# Altium integrated library myIOT_lib.IntLib: 300 symbols (part 1 of 3) (continued)
## LPC11U68JBD100 (continued)

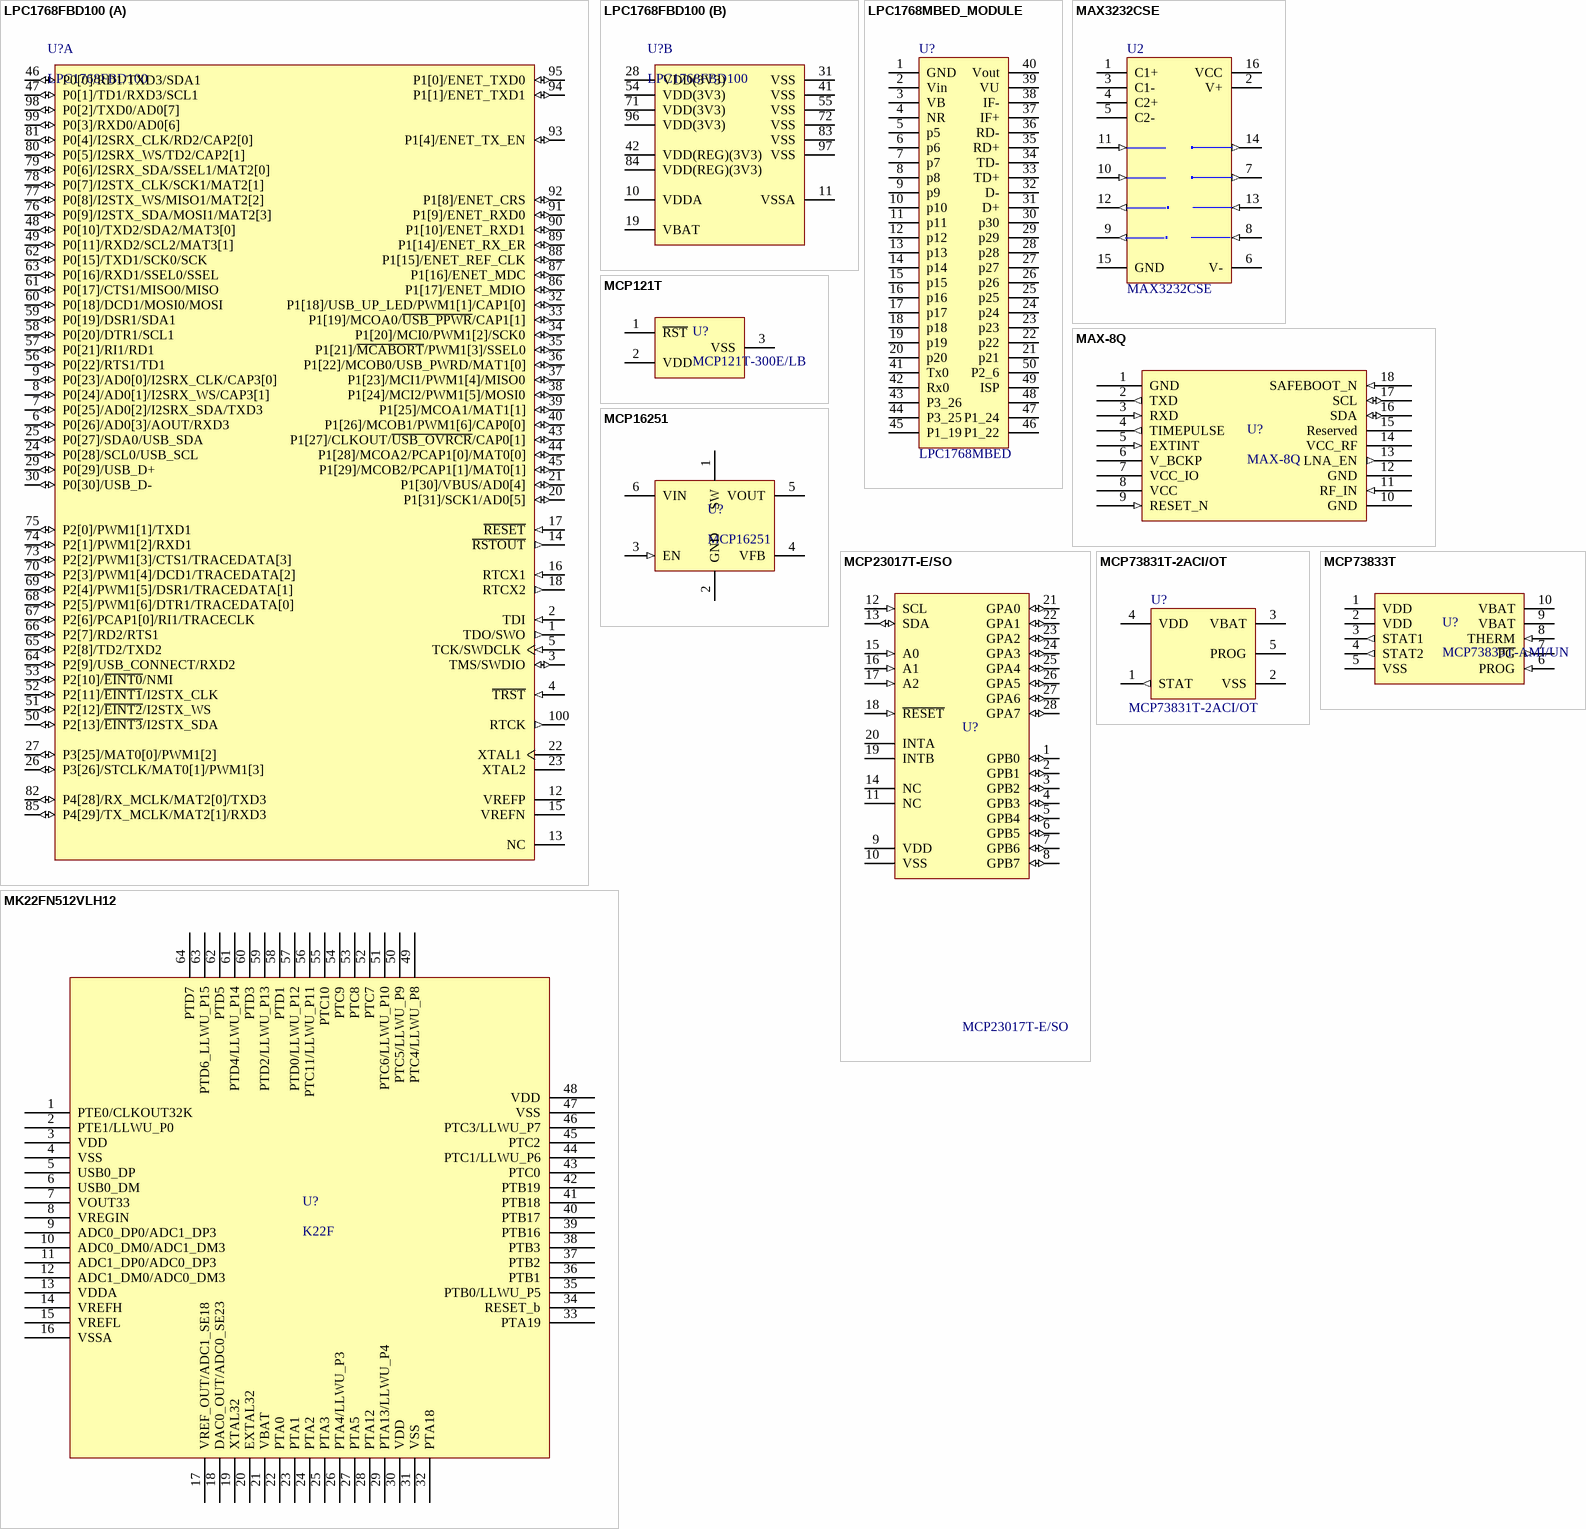
[diagram p7: symbols LPC1768FBD100 to MK22FN512VLH12]

## LPC1768FBD100
designator U?
32-Bit ARM Cortex-M3 Microcontroller, Ethernet, USB 2.0 Host / Device / OTG, CAN, 512 KB Flash, 64 KB SRAM, -40 to 85 degC, 100-Pin LQFP (SOT407-1), RoHS, Tray; MFG P/N: LPC1768FBD100K; Anunda_Code: M1200; MFG: NXP USA Inc.; RoHSCompliant: true; Width: 18.8 mm; DatasheetVersion: Rev. 9.6 , 08/2015; PackageReference: SOT407-1; Pins: 4; REACH SVHC: Unknown; Radiation Hardening: No; Packaging: Tray; PackageDescription: 100-Pin Plastic Low Profile Quad Flat Package, Body 14 x 14 mm; Value: LPC1768FBD100
footprint NXP-SOT407-1_V
part A pins: 1 TDO/SWO (out), 2 TDI (in), 3 TMS/SWDIO (io), 4 ~{TRST} (in), 5 TCK/SWDCLK (in), 6 P0[26]/AD0[3]/AOUT/RXD3 (io), 7 P0[25]/AD0[2]/I2SRX_SDA/TXD3 (io), 8 P0[24]/AD0[1]/I2SRX_WS/CAP3[1] (io), 9 P0[23]/AD0[0]/I2SRX_CLK/CAP3[0] (io), 12 VREFP, 13 NC, 14 ~{RSTOUT} (out), 15 VREFN, 16 RTCX1 (in), 17 ~{RESET} (in), 18 RTCX2 (out), 20 P1[31]/SCK1/AD0[5] (io), 21 P1[30]/VBUS/AD0[4] (io), 22 XTAL1, 23 XTAL2, 24 P0[28]/SCL0/USB_SCL (io), 25 P0[27]/SDA0/USB_SDA (io), 26 P3[26]/STCLK/MAT0[1]/PWM1[3] (io), 27 P3[25]/MAT0[0]/PWM1[2] (io), 29 P0[29]/USB_D+ (io), 30 P0[30]/USB_D- (io), 32 P1[18]/USB_UP_LED/PWM1[1]/CAP1[0] (io), 33 P1[19]/MCOA0/~{USB_PPWR}/CAP1[1] (io), 34 P1[20]/MCI0/PWM1[2]/SCK0 (io), 35 P1[21]/~{MCABORT}/PWM1[3]/SSEL0 (io), 36 P1[22]/MCOB0/USB_PWRD/MAT1[0] (io), 37 P1[23]/MCI1/PWM1[4]/MISO0 (io), 38 P1[24]/MCI2/PWM1[5]/MOSI0 (io), 39 P1[25]/MCOA1/MAT1[1] (io), 40 P1[26]/MCOB1/PWM1[6]/CAP0[0] (io), 43 P1[27]/CLKOUT/~{USB_OVRCR}/CAP0[1] (io), 44 P1[28]/MCOA2/PCAP1[0]/MAT0[0] (io), 45 P1[29]/MCOB2/PCAP1[1]/MAT0[1] (io), 46 P0[0]/RD1/TXD3/SDA1 (io), 47 P0[1]/TD1/RXD3/SCL1 (io), 48 P0[10]/TXD2/SDA2/MAT3[0] (io), 49 P0[11]/RXD2/SCL2/MAT3[1] (io), 50 P2[13]/~{EINT3}/I2STX_SDA (io), 51 P2[12]/~{EINT2}/I2STX_WS (io), 52 P2[11]/~{EINT1}/I2STX_CLK (io), 53 P2[10]/~{EINT0}/NMI (io), 56 P0[22]/RTS1/TD1 (io), 57 P0[21]/RI1/RD1 (io), 58 P0[20]/DTR1/SCL1 (io), 59 P0[19]/DSR1/SDA1 (io), 60 P0[18]/DCD1/MOSI0/MOSI (io), 61 P0[17]/CTS1/MISO0/MISO (io), 62 P0[15]/TXD1/SCK0/SCK (io), 63 P0[16]/RXD1/SSEL0/SSEL (io), 64 P2[9]/USB_CONNECT/RXD2 (io), 65 P2[8]/TD2/TXD2 (io), 66 P2[7]/RD2/RTS1 (io), 67 P2[6]/PCAP1[0]/RI1/TRACECLK (io), 68 P2[5]/PWM1[6]/DTR1/TRACEDATA[0] (io), 69 P2[4]/PWM1[5]/DSR1/TRACEDATA[1] (io), 70 P2[3]/PWM1[4]/DCD1/TRACEDATA[2] (io), 73 P2[2]/PWM1[3]/CTS1/TRACEDATA[3] (io), 74 P2[1]/PWM1[2]/RXD1 (io), 75 P2[0]/PWM1[1]/TXD1 (io), 76 P0[9]/I2STX_SDA/MOSI1/MAT2[3] (io), 77 P0[8]/I2STX_WS/MISO1/MAT2[2] (io), 78 P0[7]/I2STX_CLK/SCK1/MAT2[1] (io), 79 P0[6]/I2SRX_SDA/SSEL1/MAT2[0] (io), 80 P0[5]/I2SRX_WS/TD2/CAP2[1] (io), 81 P0[4]/I2SRX_CLK/RD2/CAP2[0] (io), 82 P4[28]/RX_MCLK/MAT2[0]/TXD3 (io), 85 P4[29]/TX_MCLK/MAT2[1]/RXD3 (io), 86 P1[17]/ENET_MDIO (io), 87 P1[16]/ENET_MDC (io), 88 P1[15]/ENET_REF_CLK (io), 89 P1[14]/ENET_RX_ER (io), 90 P1[10]/ENET_RXD1 (io), 91 P1[9]/ENET_RXD0 (io), 92 P1[8]/ENET_CRS (io), 93 P1[4]/ENET_TX_EN (io), 94 P1[1]/ENET_TXD1 (io), 95 P1[0]/ENET_TXD0 (io), 98 P0[2]/TXD0/AD0[7] (io), 99 P0[3]/RXD0/AD0[6] (io), 100 RTCK (out)
part B pins: 10 VDDA (power), 11 VSSA (power), 19 VBAT (power), 28 VDD(3V3) (power), 31 VSS (power), 41 VSS (power), 42 VDD(REG)(3V3) (power), 54 VDD(3V3) (power), 55 VSS (power), 71 VDD(3V3) (power), 72 VSS (power), 83 VSS (power), 84 VDD(REG)(3V3) (power), 96 VDD(3V3) (power), 97 VSS (power)

## LPC1768MBED_MODULE
designator U?, comment LPC1768MBED
LPC1768 MBED MODULE
footprint LPC_mini
pins: 1 GND, 2 Vin, 3 VB, 4 NR, 5 p5, 6 p6, 7 p7, 8 p8, 9 p9, 10 p10, 11 p11, 12 p12, 13 p13, 14 p14, 15 p15, 16 p16, 17 p17, 18 p18, 19 p19, 20 p20, 21 p21, 22 p22, 23 p23, 24 p24, 25 p25, 26 p26, 27 p27, 28 p28, 29 p29, 30 p30, 31 D+, 32 D-, 33 TD+, 34 TD-, 35 RD+, 36 RD-, 37 IF+, 38 IF-, 39 VU, 40 Vout, 41 Tx0, 42 Rx0, 43 P3_26, 44 P3_25, 45 P1_19, 46 P1_22, 47 P1_24, 48, 49 ISP, 50 P2_6

## MAX3232CSE
designator U2
3.0V TO 5.5V, Low-Power, up to 1Mbps, True RS-232 Transceiver Using Four 0.1ตF External Capacitor; Anunda_Code: M1363; MFG: Analog Devices Inc; MFG P/N: MAX3232CSE+T; Published: 16-Jan-2001; LatestRevisionDate: 13-Apr-2006; LatestRevisionNote: IPC-7351 Footprint Added.; DatasheetVersion: Mar-1999; PackageReference: NSO16; Publisher: Altium Limited; PackageDescription: 16-Pin Small Outline Integrated Circuit 1.27 mm Pitch; Code_JEDEC: MS-012-AC; Code_IPC: SOIC127P600-16
footprint SOIC16N_N (SOIC, 16-Leads, Body 9.9x3.9mm, Pitch 1.27mm, IPC Medium Density)
3D model NSO16 (16-Pin Small Outline Integrated Circuit 1.27 mm Pitch)
pins: 1 C1+, 2 V+ (power), 3 C1-, 4 C2+, 5 C2-, 6 V- (power), 7 T2OUT (out), 8 R2IN (in), 9 R2OUT (out), 10 T2IN (in), 11 T1IN (in), 12 R1OUT (out), 13 R1IN (in), 14 T1OUT (out), 15 GND (power), 16 VCC (power)

## MAX-8Q
designator U?
GNSS Module, Model : MAX-8Q with GPS, Ublox; Anunda_Code: N2035; Value: MAX-8Q
footprint MAX-8Q (MAX-8Q U-Blox GNSS)
pins: 1 GND, 2 TXD (out), 3 RXD (in), 4 TIMEPULSE (out), 5 EXTINT (in), 6 V_BCKP, 7 VCC_IO, 8 VCC, 9 RESET_N (in), 10 GND, 11 RF_IN (in), 12 GND, 13 LNA_EN (out), 14 VCC_RF, 15 Reserved, 16 SDA (io), 17 SCL (io), 18 SAFEBOOT_N (in)

## MCP121T
designator U?, comment MCP121T-300E/LB
MCP121T-300E/LB Micropower Voltage Supervisor 2.93V,Active LOW; Value: MCP121T-300E/LB
footprint SOT23_N_2
pins: 1 ~{RST}, 2 VDD, 3 VSS

## MCP16251
designator U?
Low Quiescent Current, PFM/PWM Synchronous Boost Regulator sot23-6
footprint SOT23-6
pins: 1 SW, 2 GND, 3 EN (in), 4 VFB, 5 VOUT, 6 VIN

## MCP23017T-E/SO
designator U?
16-Bit I/O Expander with Serial Interface, 28-Pin SOIC, Extended Temperature, Tape and Reel; Anunda_Code: M1934; DatasheetVersion: revB, Feb-2007; PackageVersion: revBB, Aug-2009; PackageReference: SOIC-SO28; Publisher: Altium Limited; PackageDescription: 28-Lead Plastic Small Outline (SO) - Wide 7.50mm Body [SOIC]; Supplier 1: Digi-Key; Supplier Part Number 1: MCP23017T-E/SO-ND; Supplier 2: Newark; Supplier Part Number 2: 31K2962; Code_JEDEC: MS-013
footprint SOIC-SO28_N (SOIC, 28-Leads, Body 17.9x7.5mm, Pitch 1.27mm, IPC Medium Density)
pins: 1 GPB0 (io), 2 GPB1 (io), 3 GPB2 (io), 4 GPB3 (io), 5 GPB4 (io), 6 GPB5 (io), 7 GPB6 (io), 8 GPB7 (io), 9 VDD (power), 10 VSS (power), 11 NC, 12 SCL (in), 13 SDA (io), 14 NC, 15 A0 (in), 16 A1 (in), 17 A2 (in), 18 ~{RESET} (in), 19 INTB (oc), 20 INTA (oc), 21 GPA0 (io), 22 GPA1 (io), 23 GPA2 (io), 24 GPA3 (io), 25 GPA4 (io), 26 GPA5 (io), 27 GPA6 (io), 28 GPA7 (io)

## MCP73831T-2ACI/OT
designator U?
Miniature Single-Cell, Fully Integrated Li-Ion, Li-Polymer Charge Management Controller, 4.2V, 5-Pin SOT-23, Industrial Temperature, Tape and Reel; Published: 29-Jan-2009; LatestRevisionDate: 27-Nov-2009; LatestRevisionNote: Updated to datasheet revision E, Sep-2008; DatasheetVersion: revE, Sep-2008; PackageVersion: revBB, Aug-2009; PackageReference: SOT-23-OT5; Publisher: Altium Limited; PackageDescription: 5-Lead Plastic Small Outline Transistor (OT) [SOT-23]; Supplier 1: Digi-Key; Supplier Part Number 1: MCP73831T-2ACI/OTTR-ND; Supplier 2: Digi-Key; Supplier Part Number 2: MCP73831T-2ACI/OTCT-ND; Supplier 3: Digi-Key; Supplier Part Number 3: MCP73831T-2ACI/OTDKR-ND; Supplier 4: Farnell; Supplier Part Number 4: 1332158; Code_IPC: SOT23-5
footprint SOT235 (SOT23, 5-Leads, Body 2.90x2.80mm, Pitch 0.95mm, IPC Medium Density)
pins: 1 STAT (out), 2 VSS (power), 3 VBAT (power), 4 VDD (power), 5 PROG

## MCP73833T
designator U?, comment MCP73833T-AMI/UN
MCP73833T Stand-Alone Linear Li-Ion / Li-Po Charge / Management Controller; Value: MCP73833T-AMI/UN
footprint MSOP10 (TSSOP, 10-Leads, Body 3.00x3.00mm, Pitch 0.50mm, IPC Medium Density)
pins: 1 VDD, 2 VDD, 3 STAT1 (out), 4 STAT2 (out), 5 VSS, 6 PROG (in), 7 ~{PG} (out), 8 THERM (in), 9 VBAT, 10 VBAT

## MK22FN512VLH12
designator U?, comment K22F
IC MK22FN512VLH12 MCU 32-Bit 512KB Flash 64LQFP ARM Cortec-M4; Anunda_Code: M2051
footprint LQFP64 (TSQFP, 64-Leads, Body 10.00x10.00mm, Pitch 0.50mm, IPC Medium Density)
pins: 1 PTE0/CLKOUT32K, 2 PTE1/LLWU_P0, 3 VDD, 4 VSS, 5 USB0_DP, 6 USB0_DM, 7 VOUT33, 8 VREGIN, 9 ADC0_DP0/ADC1_DP3, 10 ADC0_DM0/ADC1_DM3, 11 ADC1_DP0/ADC0_DP3, 12 ADC1_DM0/ADC0_DM3, 13 VDDA, 14 VREFH, 15 VREFL, 16 VSSA, 17 VREF_OUT/ADC1_SE18, 18 DAC0_OUT/ADC0_SE23, 19 XTAL32, 20 EXTAL32, 21 VBAT, 22 PTA0, 23 PTA1, 24 PTA2, 25 PTA3, 26 PTA4/LLWU_P3, 27 PTA5, 28 PTA12, 29 PTA13/LLWU_P4, 30 VDD, 31 VSS, 32 PTA18, 33 PTA19, 34 RESET_b, 35 PTB0/LLWU_P5, 36 PTB1, 37 PTB2, 38 PTB3, 39 PTB16, 40 PTB17, 41 PTB18, 42 PTB19, 43 PTC0, 44 PTC1/LLWU_P6, 45 PTC2, 46 PTC3/LLWU_P7, 47 VSS, 48 VDD, 49 PTC4/LLWU_P8, 50 PTC5/LLWU_P9, 51 PTC6/LLWU_P10, 52 PTC7, 53 PTC8, 54 PTC9, 55 PTC10, 56 PTC11/LLWU_P11, 57 PTD0/LLWU_P12, 58 PTD1, 59 PTD2/LLWU_P13, 60 PTD3, 61 PTD4/LLWU_P14, 62 PTD5, 63 PTD6_LLWU_P15, 64 PTD7

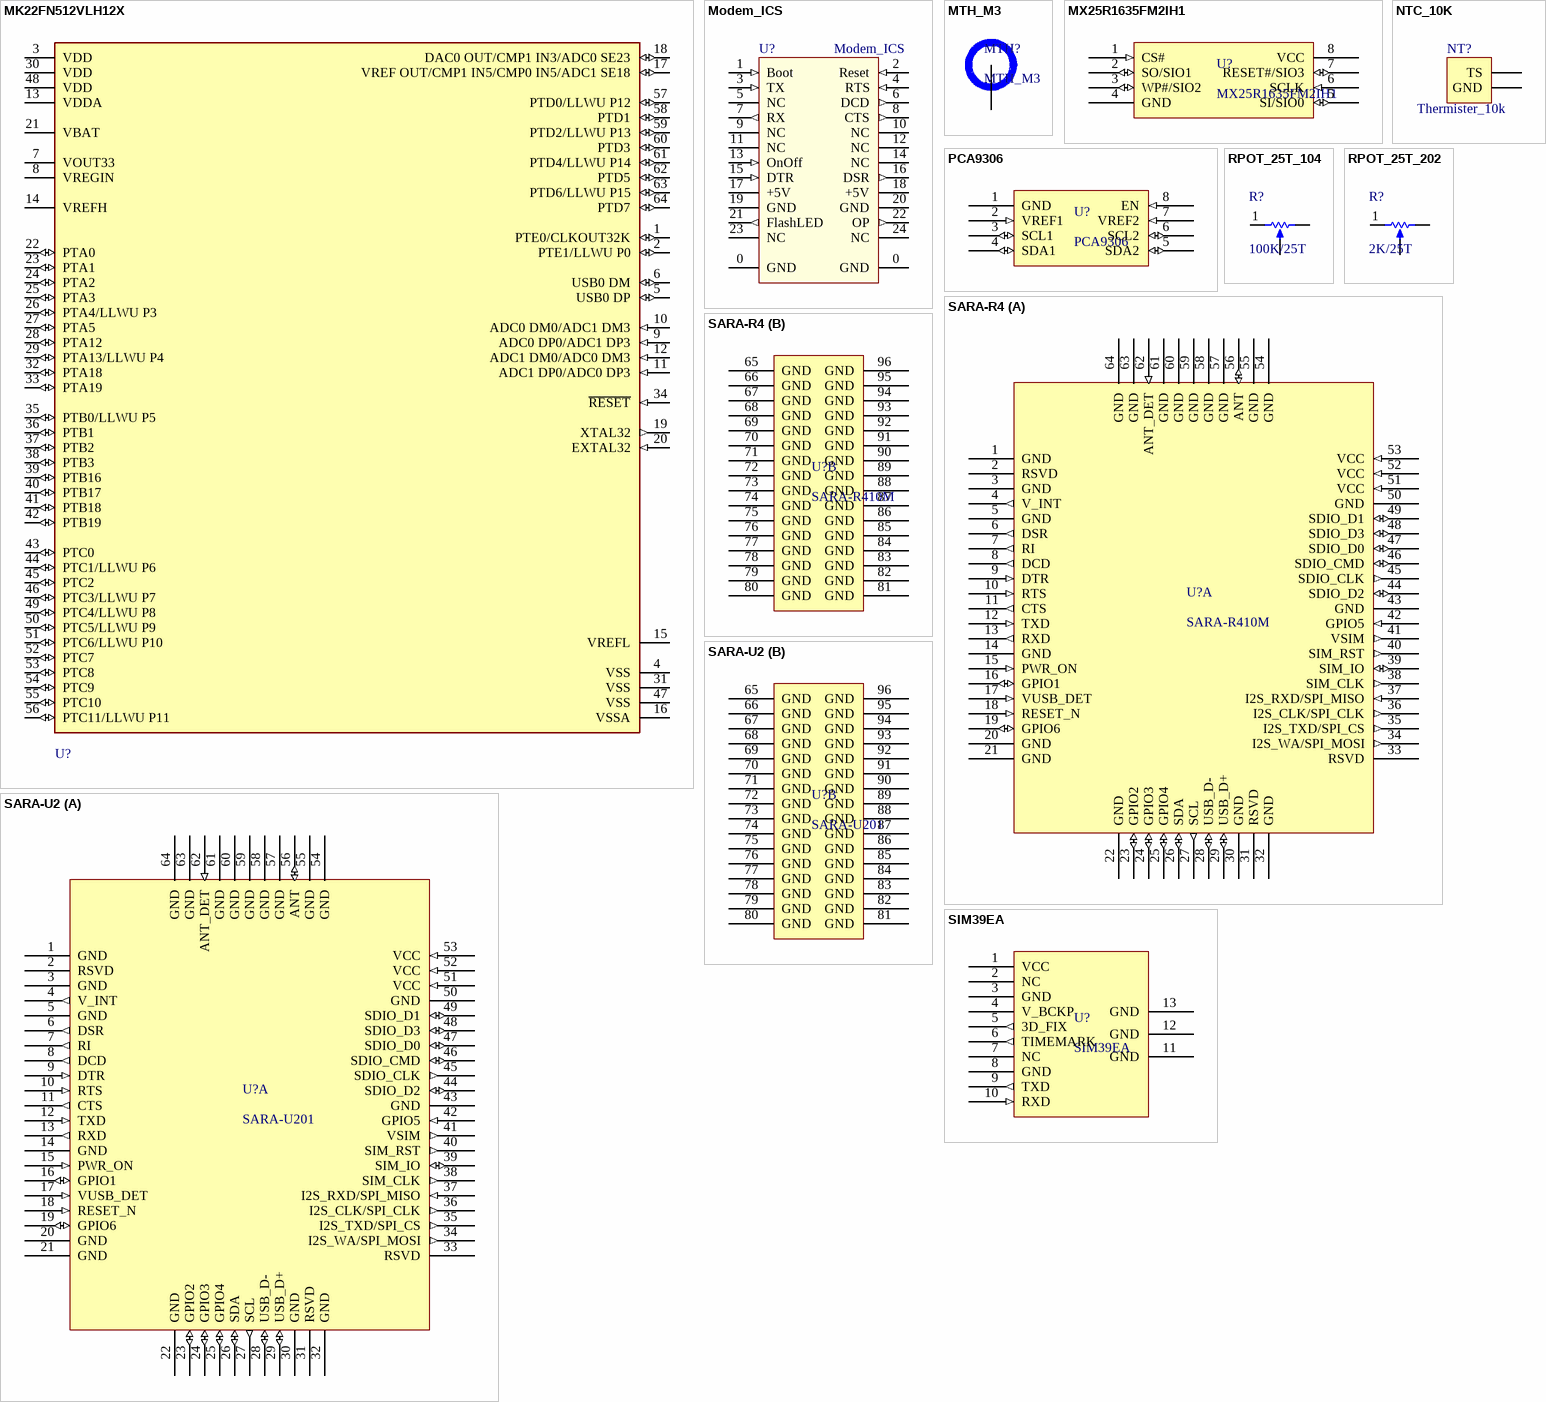
[diagram p8: symbols MK22FN512VLH12X to SIM39EA]

## MK22FN512VLH12X
designator U?, comment MK22FN512VLH12  (value not drawn)
IC MK22FN512VLH12 MCU 32-Bit 512KB Flash 64LQFP ARM Cortec-M4; Anunda_Code: M2051; Value: MK22FN512VLH12
footprint LQFP64_WFID (TSQFP, 64-Leads, Body 10.00x10.00mm, Pitch 0.50mm, IPC Medium Density)
pins: 1 PTE0/CLKOUT32K (io), 2 PTE1/LLWU P0 (io), 3 VDD (power), 4 VSS (power), 5 USB0 DP (io), 6 USB0 DM (io), 7 VOUT33 (power), 8 VREGIN (power), 9 ADC0 DP0/ADC1 DP3 (in), 10 ADC0 DM0/ADC1 DM3 (in), 11 ADC1 DP0/ADC0 DP3 (in), 12 ADC1 DM0/ADC0 DM3 (in), 13 VDDA (power), 14 VREFH (power), 15 VREFL (power), 16 VSSA (power), 17 VREF OUT/CMP1 IN5/CMP0 IN5/ADC1 SE18 (io), 18 DAC0 OUT/CMP1 IN3/ADC0 SE23 (io), 19 XTAL32 (out), 20 EXTAL32 (in), 21 VBAT (power), 22 PTA0 (io), 23 PTA1 (io), 24 PTA2 (io), 25 PTA3 (io), 26 PTA4/LLWU P3 (io), 27 PTA5 (io), 28 PTA12 (io), 29 PTA13/LLWU P4 (io), 30 VDD (power), 31 VSS (power), 32 PTA18 (io), 33 PTA19 (io), 34 ~{RESET} (in), 35 PTB0/LLWU P5 (io), 36 PTB1 (io), 37 PTB2 (io), 38 PTB3 (io), 39 PTB16 (io), 40 PTB17 (io), 41 PTB18 (io), 42 PTB19 (io), 43 PTC0 (io), 44 PTC1/LLWU P6 (io), 45 PTC2 (io), 46 PTC3/LLWU P7 (io), 47 VSS (power), 48 VDD (power), 49 PTC4/LLWU P8 (io), 50 PTC5/LLWU P9 (io), 51 PTC6/LLWU P10 (io), 52 PTC7 (io), 53 PTC8 (io), 54 PTC9 (io), 55 PTC10 (io), 56 PTC11/LLWU P11 (io), 57 PTD0/LLWU P12 (io), 58 PTD1 (io), 59 PTD2/LLWU P13 (io), 60 PTD3 (io), 61 PTD4/LLWU P14 (io), 62 PTD5 (io), 63 PTD6/LLWU P15 (io), 64 PTD7 (io)

## Modem_ICS
designator U?
footprint Modem1_ICS (first modem design footprint)
pins: 0 GND (power), 0 GND (power), 1 Boot (in), 2 Reset (in), 3 TX (in), 4 RTS (in), 5 NC (hiz), 6 DCD (out), 7 RX (out), 8 CTS (out), 9 NC (hiz), 10 NC (hiz), 11 NC (hiz), 12 NC (hiz), 13 OnOff (in), 14 NC (hiz), 15 DTR (in), 16 DSR (out), 17 +5V (power), 18 +5V (power), 19 GND (power), 20 GND (power), 21 FlashLED (out), 22 OP (out), 23 NC (hiz), 24 NC (hiz)

## MTH_M3
designator MTH?  (no BOM)
Mounting Hole M3 diameter 3.2mm
footprint PTH_M3 (Mounting Hole M3  hole 3.2mm Dia 6 mm)
pins: 0 MTH

## MX25R1635FM2IH1
designator U?
NOR-Flash Macronix MX25R1635FM2IH1; Anunda_Code: M1945; MFG P/N: MX25R1635FM2IL0; MFG: Macronix
footprint SOIC-8_208mil
pins: 1 CS# (in), 2 SO/SIO1 (io), 3 WP#/SIO2 (io), 4 GND, 5 SI/SIO0 (io), 6 SCLK (in), 7 RESET#/SIO3 (io), 8 VCC (power)

## NTC_10K
designator NT?, comment Thermister_10k
NTC 10K , 2-Pin; LatestRevisionDate: 17-Jul-2002; LatestRevisionNote: Re-released for DXP Platform.; Publisher: Altium Limited
footprint NTC1X2 (NTC Connector; Header; 1x2 Position)
signal-integrity model Connector
pins: 1 GND, 2 TS

## PCA9306
designator U?
IC VOLT-LVL TRANSL PCA9306DTR2G Translator TSSOP-8; Anunda_Code: M1920
footprint TSSOP8 (TSSOP, 8-Leads, Body 3.00x4.40mm, Pitch 0.65mm, IPC Medium Density)
pins: 1 GND, 2 VREF1 (in), 3 SCL1 (io), 4 SDA1 (io), 5 SDA2 (io), 6 SCL2 (io), 7 VREF2 (in), 8 EN (in)

## RPOT_25T_104
designator R?, comment 100K/25T
Potentiometer 100 kOhm 25T Top Adj.; Sim Note: Enter the Resistance value and the set point into parameter fields.; Set Position: 0.5; Published: 8-Jun-2000; LatestRevisionDate: 17-Jul-2002; LatestRevisionNote: Re-released for DXP Platform.; PackageReference: VR5; Publisher: Altium Limited; Value: 100K/25T; Anunda_Code: *
footprint 3296W (3296-3/8 Square Trimming Pot Ver adj.)
simulation model POT (Potentiometer)
pins: 1 CCW, 2 TAP, 3 CW
1 alternate drawing of the same symbol

## RPOT_25T_202
designator R?, comment 2K/25T
Potentiometer 2 kOhm 25T Top Adj.; Sim Note: Enter the Resistance value and the set point into parameter fields.; Set Position: 0.5; Anunda_Code: M1330; Published: 8-Jun-2000; LatestRevisionDate: 17-Jul-2002; LatestRevisionNote: Re-released for DXP Platform.; PackageReference: VR5; Publisher: Altium Limited; Value: 2K/25T
footprint 3296W (3296-3/8 Square Trimming Pot Ver adj.)
simulation model POT (Potentiometer)
pins: 1 CCW, 2 TAP, 3 CW
1 alternate drawing of the same symbol

## SARA-R4
designator U?, comment SARA-R410M
LTE NB-IoT Module, Model : SARA-R410M Cat.M1, Ublox; Anunda_Code: N2034; Value: SARA-R410M
footprint SARA - LPAD (SARA UBLOX MODULE)
part A pins: 1 GND, 2 RSVD, 3 GND, 4 V_INT (out), 5 GND, 6 DSR (out), 7 RI (out), 8 DCD (out), 9 DTR (in), 10 RTS (in), 11 CTS (out), 12 TXD (in), 13 RXD (out), 14 GND, 15 PWR_ON (in), 16 GPIO1 (io), 17 VUSB_DET (in), 18 RESET_N (in), 19 GPIO6 (io), 20 GND, 21 GND, 22 GND, 23 GPIO2 (io), 24 GPIO3 (io), 25 GPIO4 (io), 26 SDA (io), 27 SCL (out), 28 USB_D- (io), 29 USB_D+ (io), 30 GND, 31 RSVD, 32 GND, 33 RSVD, 34 I2S_WA/SPI_MOSI (out), 35 I2S_TXD/SPI_CS (out), 36 I2S_CLK/SPI_CLK (out), 37 I2S_RXD/SPI_MISO (in), 38 SIM_CLK (out), 39 SIM_IO (io), 40 SIM_RST (out), 41 VSIM (out), 42 GPIO5 (in), 43 GND, 44 SDIO_D2 (io), 45 SDIO_CLK (out), 46 SDIO_CMD (io), 47 SDIO_D0 (io), 48 SDIO_D3 (io), 49 SDIO_D1 (io), 50 GND, 51 VCC (in), 52 VCC (in), 53 VCC (in), 54 GND, 55 GND, 56 ANT (io), 57 GND, 58 GND, 59 GND, 60 GND, 61 GND, 62 ANT_DET (in), 63 GND, 64 GND
part B pins: 65 GND, 66 GND, 67 GND, 68 GND, 69 GND, 70 GND, 71 GND, 72 GND, 73 GND, 74 GND, 75 GND, 76 GND, 77 GND, 78 GND, 79 GND, 80 GND, 81 GND, 82 GND, 83 GND, 84 GND, 85 GND, 86 GND, 87 GND, 88 GND, 89 GND, 90 GND, 91 GND, 92 GND, 93 GND, 94 GND, 95 GND, 96 GND

## SARA-U2
designator U?, comment SARA-U201
HSPA/GSM Module, Model : SARA-U201 for Global coverage, Ublox; Anunda_Code: N2036; Value: SARA-U201
footprint SARA - LPAD (SARA UBLOX MODULE)
part A pins: 1 GND, 2 RSVD, 3 GND, 4 V_INT (out), 5 GND, 6 DSR (out), 7 RI (out), 8 DCD (out), 9 DTR (in), 10 RTS (in), 11 CTS (out), 12 TXD (in), 13 RXD (out), 14 GND, 15 PWR_ON (in), 16 GPIO1 (io), 17 VUSB_DET (in), 18 RESET_N (in), 19 GPIO6 (io), 20 GND, 21 GND, 22 GND, 23 GPIO2 (io), 24 GPIO3 (io), 25 GPIO4 (io), 26 SDA (io), 27 SCL (out), 28 USB_D- (io), 29 USB_D+ (io), 30 GND, 31 RSVD, 32 GND, 33 RSVD, 34 I2S_WA/SPI_MOSI (out), 35 I2S_TXD/SPI_CS (out), 36 I2S_CLK/SPI_CLK (out), 37 I2S_RXD/SPI_MISO (in), 38 SIM_CLK (out), 39 SIM_IO (io), 40 SIM_RST (out), 41 VSIM (out), 42 GPIO5 (in), 43 GND, 44 SDIO_D2 (io), 45 SDIO_CLK (out), 46 SDIO_CMD (io), 47 SDIO_D0 (io), 48 SDIO_D3 (io), 49 SDIO_D1 (io), 50 GND, 51 VCC (in), 52 VCC (in), 53 VCC (in), 54 GND, 55 GND, 56 ANT (io), 57 GND, 58 GND, 59 GND, 60 GND, 61 GND, 62 ANT_DET (in), 63 GND, 64 GND
part B pins: 65 GND, 66 GND, 67 GND, 68 GND, 69 GND, 70 GND, 71 GND, 72 GND, 73 GND, 74 GND, 75 GND, 76 GND, 77 GND, 78 GND, 79 GND, 80 GND, 81 GND, 82 GND, 83 GND, 84 GND, 85 GND, 86 GND, 87 GND, 88 GND, 89 GND, 90 GND, 91 GND, 92 GND, 93 GND, 94 GND, 95 GND, 96 GND

## SIM39EA
designator U?
pins: 1 VCC, 2 NC, 3 GND, 4 V_BCKP, 5 3D_FIX (out), 6 TIMEMARK (out), 7 NC, 8 GND, 9 TXD (out), 10 RXD (in), 11 GND, 12 GND, 13 GND

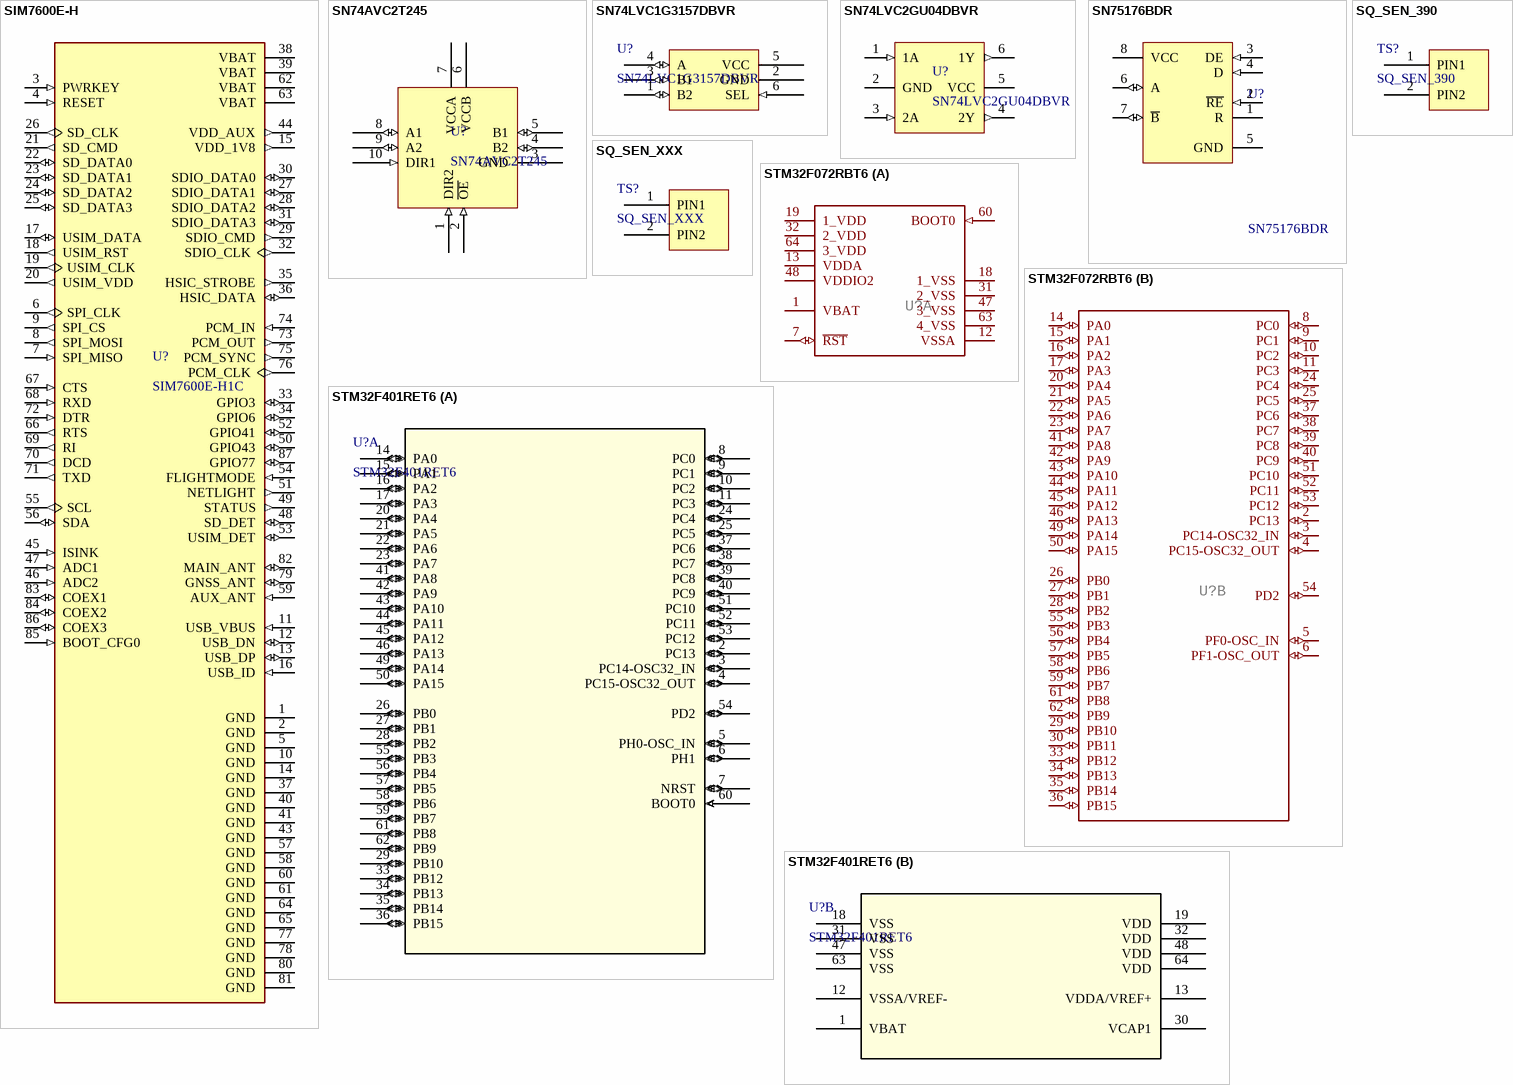
[diagram p9: symbols SIM7600E-H to STM32F401RET6]

## SIM7600E-H
designator U?, comment SIM7600E-H1C
4G LTE Module, Model : SIM7600E-H1C, SIMCOM; Anunda_Code: N2573; MP: SIM7600E-H; Package: None; MF: Simcom; Value: *; Price: None; SnapEDA_Link: https://www.snapeda.com/parts/SIM7600E-H/SIMcom%20Wireless%20solutions%20Co.%2CLtd/view-part/2758290/?ref=snap
footprint SIM7600E_H (LCC Package 87pin)
pins: 1 GND (power), 2 GND (power), 3 PWRKEY (in), 4 RESET (in), 5 GND (power), 6 SPI_CLK (out), 7 SPI_MISO (in), 8 SPI_MOSI (out), 9 SPI_CS (out), 10 GND (power), 11 USB_VBUS (in), 12 USB_DN (io), 13 USB_DP (io), 14 GND (power), 15 VDD_1V8 (out), 16 USB_ID (in), 17 USIM_DATA (io), 18 USIM_RST (out), 19 USIM_CLK (out), 20 USIM_VDD (out), 21 SD_CMD (out), 22 SD_DATA0 (io), 23 SD_DATA1 (io), 24 SD_DATA2 (io), 25 SD_DATA3 (io), 26 SD_CLK (out), 27 SDIO_DATA1 (io), 28 SDIO_DATA2 (io), 29 SDIO_CMD (out), 30 SDIO_DATA0 (io), 31 SDIO_DATA3 (io), 32 SDIO_CLK (out), 33 GPIO3 (io), 34 GPIO6 (io), 35 HSIC_STROBE (out), 36 HSIC_DATA (io), 37 GND (power), 38 VBAT (power), 39 VBAT (power), 40 GND (power), 41 GND (power), 43 GND (power), 44 VDD_AUX (out), 45 ISINK (in), 46 ADC2 (in), 47 ADC1 (in), 48 SD_DET (io), 49 STATUS (out), 50 GPIO43 (io), 51 NETLIGHT (out), 52 GPIO41 (io), 53 USIM_DET (io), 54 FLIGHTMODE (in), 55 SCL (out), 56 SDA (io), 57 GND (power), 58 GND (power), 59 AUX_ANT (in), 60 GND (power), 61 GND (power), 62 VBAT (power), 63 VBAT (power), 64 GND (power), 65 GND (power), 66 RTS (out), 67 CTS (in), 68 RXD (in), 69 RI (out), 70 DCD (out), 71 TXD (out), 72 DTR (in), 73 PCM_OUT (out), 74 PCM_IN (in), 75 PCM_SYNC (out), 76 PCM_CLK (out), 77 GND (power), 78 GND (power), 79 GNSS_ANT (io), 80 GND (power), 81 GND (power), 82 MAIN_ANT (io), 83 COEX1 (io), 84 COEX2 (io), 85 BOOT_CFG0 (in), 86 COEX3 (io), 87 GPIO77 (io)

## SN74AVC2T245
designator U?
SN74AVC2T245  Dual-Bit  Dual-Supply  Bus Transceiver  with Configurable  Level-Shifting  /  Voltage  Translation  and Tri-State  Outputs
footprint 10-UQFN (PQFN, 10-Leads, Body 1.40x1.80mm, Pitch 0.40mm, IPC Medium Density)
pins: 1 DIR2 (in), 2 ~{OE} (in), 3 GND, 4 B2 (io), 5 B1 (io), 6 VCCB, 7 VCCA, 8 A1 (io), 9 A2 (io), 10 DIR1 (in)

## SN74LVC1G3157DBVR
designator U?
IC SN74LVC1G3157DBVR Analog Switch SPDT 340 MHz 1.65V to 5.5V; Anunda_Code: M2090
footprint SOT23-6
pins: 1 B2 (io), 2 GND, 3 B1 (io), 4 A (io), 5 VCC, 6 SEL (in)

## SN74LVC2GU04DBVR
designator U?
SN74LVC2GU04DBVR  sot-23-6
footprint SOT23-6
pins: 1 1A (in), 2 GND, 3 2A (in), 4 2Y (out), 5 VCC (power), 6 1Y (out)